# Altium footprint library lib_datalogger.PcbLib: 866 footprints (part 24 of 55)
Each footprint in its own frame and in the unit in brackets; x right, y up, seen from the top. Pads: shape width x height; smd on the part's side, far side on the other; paste and mask are expansions set on the pad; w line width, h text height; cw(c..) or ccw(c..) is an arc to the next point about the centre after c.
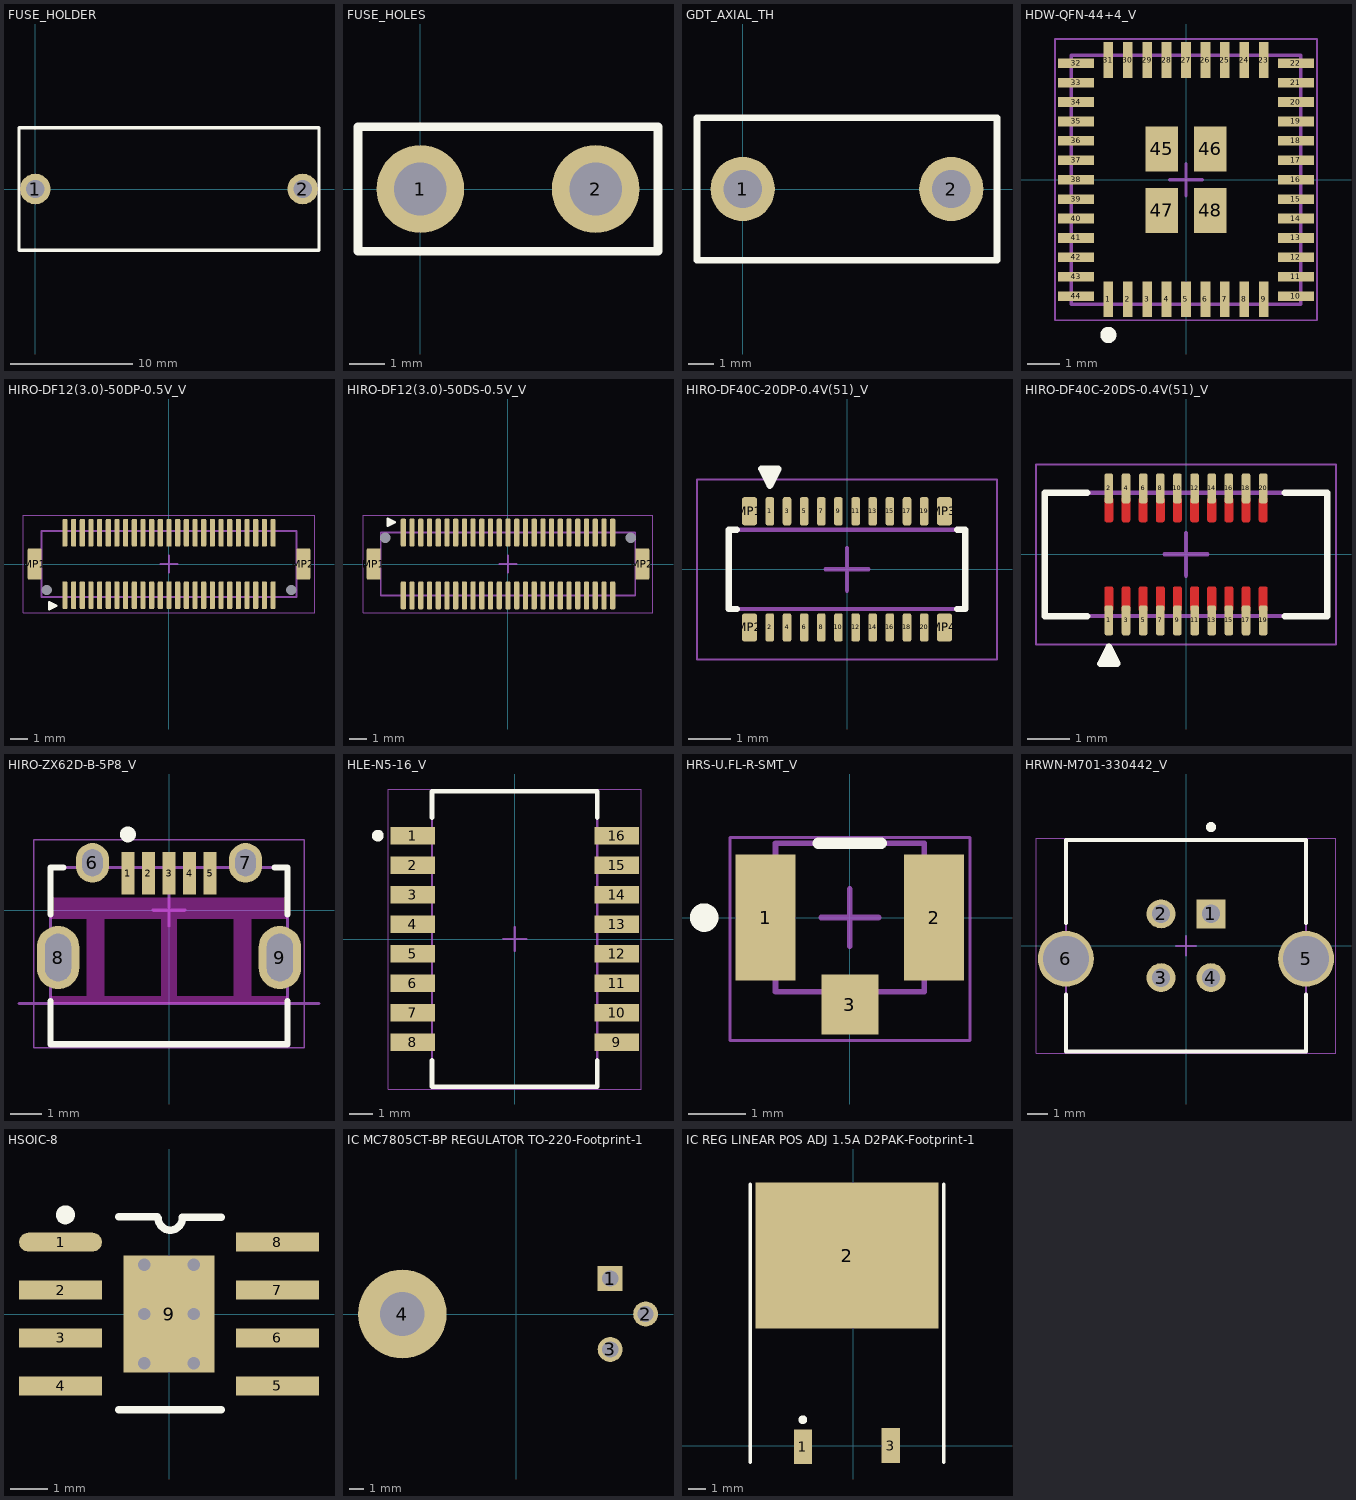
[diagram p23: the footprints below, top view; thin cyan lines are the x and y axes]

## FUSE_HOLDER [mm]
pads (2):
  round 2.5 hole 1.5: 1(0,0) 2(21.84,0)
Top Overlay:
  lines w0.254: -1.33,-5 -1.33,5 23.17,5 23.17,-5 -1.33,-5
3D body "fh2.step": height 10.8, standoff -3, extent -1.18,-4.9 23.02,4.9

## FUSE_HOLES [mm]
pads (2):
  round 2.5 hole 1.5: 1(0,0) 2(5,0)
Top Overlay:
  lines w0.254: -1.782,-1.778 6.782,-1.778 6.782,1.778 -1.782,1.778 -1.782,-1.778

## GDT_AXIAL_TH [mm]
pads (2):
  round 2.5 hole 1.5: 1(0,0) 2(8.128,0)
Top Overlay:
  lines w0.254: -1.782,-2.769 -1.782,2.769 9.91,2.769 9.91,-2.769 -1.782,-2.769
3D body "2037-09-B.step": height 10, standoff -3.7, extent -0.26,-2.489 8.54,2.511

## genericTLS [mm]
3D body "Placa_TLS_2.0.step": height -2.75, standoff -20.4, extent -32.4,-28.2 33.475,28.613

## HDW-QFN-44+4_V [mm] "QFN, 44-Leads, Body 7.7x7.1mm, Pitch 0.6mm"
height 1.4
pads (48):
  rect 0.3x1.1 smd: 1(-2.4,-3.7) 2(-1.8,-3.7) 3(-1.2,-3.7) 4(-0.6,-3.7) 5(0,-3.7) 6(0.6,-3.7) 7(1.2,-3.7) 8(1.8,-3.7) 9(2.4,-3.7) 23(2.4,3.7) 24(1.8,3.7) 25(1.2,3.7) 26(0.6,3.7) 27(0,3.7) 28(-0.6,3.7) 29(-1.2,3.7) 30(-1.8,3.7) 31(-2.4,3.7)
  rect 1.1x0.3 smd: 10(3.4,-3.6) 11(3.4,-3) 12(3.4,-2.4) 13(3.4,-1.8) 14(3.4,-1.2) 15(3.4,-0.6) 16(3.4,0) 17(3.4,0.6) 18(3.4,1.2) 19(3.4,1.8) 20(3.4,2.4) 21(3.4,3) 22(3.4,3.6) 32(-3.4,3.6) 33(-3.4,3) 34(-3.4,2.4) 35(-3.4,1.8) 36(-3.4,1.2) 37(-3.4,0.6) 38(-3.4,0) 39(-3.4,-0.6) 40(-3.4,-1.2) 41(-3.4,-1.8) 42(-3.4,-2.4) 43(-3.4,-3) 44(-3.4,-3.6)
  rect 1x1.4 smd: 45(-0.75,0.95) 46(0.75,0.95) 47(-0.75,-0.95) 48(0.75,-0.95)
Top Overlay:
  circle w0.25: c-2.4,-4.8 r0.125
Mechanical 13:
  lines w0.1: -3.55,-3.85 -3.55,3.85 3.55,3.85 3.55,-3.85 -3.55,-3.85
Mechanical 15:
  lines w0.05: -4.05,-4.35 -4.05,4.35 4.05,4.35 4.05,-4.35 -4.05,-4.35
  lines w0.1: -0.5,0 0.5,0 ; 0,-0.5 0,0.5
3D body: height 1.4, standoff 0, extent -3.55,-3.85 3.55,3.85

## HIRO-DF12(3.0)-50DP-0.5V_V [mm] "SMD, 50-Leads, Body 14.7x3.8mm, Pitch 0.5mm"
height 3.2
pads (54):
  rrect50% 0.3x1.6 smd paste-0.01: 1(-6,-1.8) 2(-6,1.8) 3(-5.5,-1.8) 4(-5.5,1.8) 5(-5,-1.8) 6(-5,1.8) 7(-4.5,-1.8) 8(-4.5,1.8) 9(-4,-1.8) 10(-4,1.8) 11(-3.5,-1.8) 12(-3.5,1.8) 13(-3,-1.8) 14(-3,1.8) 15(-2.5,-1.8) 16(-2.5,1.8) 17(-2,-1.8) 18(-2,1.8) 19(-1.5,-1.8) 20(-1.5,1.8) 21(-1,-1.8) 22(-1,1.8) 23(-0.5,-1.8) 24(-0.5,1.8) 25(0,-1.8) 26(0,1.8) 27(0.5,-1.8) 28(0.5,1.8) 29(1,-1.8) 30(1,1.8) 31(1.5,-1.8) 32(1.5,1.8) 33(2,-1.8) 34(2,1.8) 35(2.5,-1.8) 36(2.5,1.8) 37(3,-1.8) 38(3,1.8) 39(3.5,-1.8) 40(3.5,1.8) 41(4,-1.8) 42(4,1.8) 43(4.5,-1.8) 44(4.5,1.8) 45(5,-1.8) 46(5,1.8) 47(5.5,-1.8) 48(5.5,1.8) 49(6,-1.8) 50(6,1.8)
  round 0 hole 0.6 unplated: H1(7.05,-1.5) H2(-7.05,-1.5)
  rrect20% 0.8x1.8 smd: MP1(-7.75,0) MP2(7.75,0)
Top Overlay:
  region: -6.9,-2.6 -6.9,-2.2 -6.5,-2.4
  lines w0.15: -6.9,-2.6 -6.5,-2.4 -6.9,-2.2 -6.9,-2.6
Mechanical 13:
  lines w0.1: -7.35,-1.9 -7.35,1.9 7.35,1.9 7.35,-1.9 -7.35,-1.9
Mechanical 15:
  lines w0.05: -8.4,-2.8 8.4,-2.8 8.4,2.8 -8.4,2.8 -8.4,-2.8
  lines w0.1: -0.5,0 0.5,0 ; 0,-0.5 0,0.5
Top Designator:
  text ".Designator" at -1.27,-0.127 h0.6
3D body "DF12(3.0)-50DP-0.5V.stp": height 2.3, standoff -0.6, extent -7.8,-2.3 7.8,2.3

## HIRO-DF12(3.0)-50DS-0.5V_V [mm] "SMD, 50-Leads, Body 14.6x3.6mm, Pitch 0.5mm"
height 2.4
pads (54):
  rrect50% 0.3x1.6 smd paste-0.01: 1(-6,1.8) 2(-6,-1.8) 3(-5.5,1.8) 4(-5.5,-1.8) 5(-5,1.8) 6(-5,-1.8) 7(-4.5,1.8) 8(-4.5,-1.8) 9(-4,1.8) 10(-4,-1.8) 11(-3.5,1.8) 12(-3.5,-1.8) 13(-3,1.8) 14(-3,-1.8) 15(-2.5,1.8) 16(-2.5,-1.8) 17(-2,1.8) 18(-2,-1.8) 19(-1.5,1.8) 20(-1.5,-1.8) 21(-1,1.8) 22(-1,-1.8) 23(-0.5,1.8) 24(-0.5,-1.8) 25(0,1.8) 26(0,-1.8) 27(0.5,1.8) 28(0.5,-1.8) 29(1,1.8) 30(1,-1.8) 31(1.5,1.8) 32(1.5,-1.8) 33(2,1.8) 34(2,-1.8) 35(2.5,1.8) 36(2.5,-1.8) 37(3,1.8) 38(3,-1.8) 39(3.5,1.8) 40(3.5,-1.8) 41(4,1.8) 42(4,-1.8) 43(4.5,1.8) 44(4.5,-1.8) 45(5,1.8) 46(5,-1.8) 47(5.5,1.8) 48(5.5,-1.8) 49(6,1.8) 50(6,-1.8)
  round 0 hole 0.6 unplated: H1(-7.05,1.5) H2(7.05,1.5)
  rrect20% 0.8x1.8 smd: MP1(-7.7,0) MP2(7.7,0)
Top Overlay:
  region: -6.9,2.6 -6.9,2.2 -6.5,2.4
  lines w0.15: -6.9,2.2 -6.9,2.6 -6.5,2.4 -6.9,2.2
Mechanical 13:
  lines w0.1: -7.3,-1.8 -7.3,1.8 7.3,1.8 7.3,-1.8 -7.3,-1.8
Mechanical 15:
  lines w0.05: -8.3,-2.8 8.3,-2.8 8.3,2.8 -8.3,2.8 -8.3,-2.8
  lines w0.1: -0.5,0 0.5,0 ; 0,-0.5 0,0.5
Top Designator:
  text ".Designator" at -1.27,-0.127 h0.6
3D body "DF12(3.0)-50DS-0.5V.stp": height 2.2, standoff -0.6, extent -7.8,-2.3 7.8,2.3

## HIRO-DF40C-20DP-0.4V(51)_V [mm] "CONN, 20-Lead, Body 5.52x1.85mm, Pitch 0.4mm"
height 1.29
pads (24):
  rrect50% 0.2x0.66 smd: 1(-1.8,1.355) 2(-1.8,-1.355) 3(-1.4,1.355) 4(-1.4,-1.355) 5(-1,1.355) 6(-1,-1.355) 7(-0.6,1.355) 8(-0.6,-1.355) 9(-0.2,1.355) 10(-0.2,-1.355) 11(0.2,1.355) 12(0.2,-1.355) 13(0.6,1.355) 14(0.6,-1.355) 15(1,1.355) 16(1,-1.355) 17(1.4,1.355) 18(1.4,-1.355) 19(1.8,1.355) 20(1.8,-1.355)
  rrect35% 0.35x0.66 smd: MP1(-2.275,1.355) MP2(-2.275,-1.355) MP3(2.275,1.355) MP4(2.275,-1.355)
Top Overlay:
  region: -1.6,2.35 -2,2.35 -1.8,1.95
  lines w0.15: -2.575,-0.925 -2.76,-0.925 -2.76,0.925 -2.575,0.925 ; 2.575,-0.925 2.76,-0.925 2.76,0.925 2.575,0.925 ; -2,2.35 -1.8,1.95 -1.6,2.35 -2,2.35
Mechanical 13:
  lines w0.1: -2.76,-0.925 -2.76,0.925 2.76,0.925 2.76,-0.925 -2.76,-0.925
Mechanical 15:
  lines w0.05: -3.5,-2.1 3.5,-2.1 3.5,2.1 -3.5,2.1 -3.5,-2.1
  lines w0.1: -0.5,0 0.5,0 ; 0,-0.5 0,0.5
Top Designator:
  text ".Designator" at -1.27,-0.127 h0.6
3D body "DF40C-20DP.stp": height 1.14, standoff 0, extent -2.76,-1.485 2.76,1.485

## HIRO-DF40C-20DS-0.4V(51)_V [mm] "CONN, 20-Lead, Body 6.6x2.88mm, Pitch 0.4mm"
height 1.65
pads (20):
  rrect50% 0.2x0.7 smd: 1(-1.8,-1.54) 2(-1.8,1.54) 3(-1.4,-1.54) 4(-1.4,1.54) 5(-1,-1.54) 6(-1,1.54) 7(-0.6,-1.54) 8(-0.6,1.54) 9(-0.2,-1.54) 10(-0.2,1.54) 11(0.2,-1.54) 12(0.2,1.54) 13(0.6,-1.54) 14(0.6,1.54) 15(1,-1.54) 16(1,1.54) 17(1.4,-1.54) 18(1.4,1.54) 19(1.8,-1.54) 20(1.8,1.54)
Top Layer:
  region: -1.9,-1.3 -1.7,-1.3 -1.7,-0.8 -1.7,-0.79 -1.708,-0.772 -1.722,-0.758 -1.74,-0.75 -1.75,-0.75 -1.85,-0.75 -1.86,-0.75 -1.878,-0.758 -1.892,-0.772 -1.9,-0.79 -1.9,-0.8
  region: -1.5,-1.3 -1.3,-1.3 -1.3,-0.8 -1.3,-0.79 -1.308,-0.772 -1.322,-0.758 -1.34,-0.75 -1.35,-0.75 -1.45,-0.75 -1.46,-0.75 -1.478,-0.758 -1.492,-0.772 -1.5,-0.79 -1.5,-0.8
  region: -1.1,-1.3 -0.9,-1.3 -0.9,-0.8 -0.9,-0.79 -0.908,-0.772 -0.922,-0.758 -0.94,-0.75 -0.95,-0.75 -1.05,-0.75 -1.06,-0.75 -1.078,-0.758 -1.092,-0.772 -1.1,-0.79 -1.1,-0.8
  region: -0.7,-1.3 -0.5,-1.3 -0.5,-0.8 -0.5,-0.79 -0.508,-0.772 -0.522,-0.758 -0.54,-0.75 -0.55,-0.75 -0.65,-0.75 -0.66,-0.75 -0.678,-0.758 -0.692,-0.772 -0.7,-0.79 -0.7,-0.8
  region: -0.3,-1.3 -0.1,-1.3 -0.1,-0.8 -0.1,-0.79 -0.108,-0.772 -0.122,-0.758 -0.14,-0.75 -0.15,-0.75 -0.25,-0.75 -0.26,-0.75 -0.278,-0.758 -0.292,-0.772 -0.3,-0.79 -0.3,-0.8
  region: 0.1,-1.3 0.3,-1.3 0.3,-0.8 0.3,-0.79 0.292,-0.772 0.278,-0.758 0.26,-0.75 0.25,-0.75 0.15,-0.75 0.14,-0.75 0.122,-0.758 0.108,-0.772 0.1,-0.79 0.1,-0.8
  region: 0.5,-1.3 0.7,-1.3 0.7,-0.8 0.7,-0.79 0.692,-0.772 0.678,-0.758 0.66,-0.75 0.65,-0.75 0.55,-0.75 0.54,-0.75 0.522,-0.758 0.508,-0.772 0.5,-0.79 0.5,-0.8
  region: 0.9,-1.3 1.1,-1.3 1.1,-0.8 1.1,-0.79 1.092,-0.772 1.078,-0.758 1.06,-0.75 1.05,-0.75 0.95,-0.75 0.94,-0.75 0.922,-0.758 0.908,-0.772 0.9,-0.79 0.9,-0.8
  region: 1.3,-1.3 1.5,-1.3 1.5,-0.8 1.5,-0.79 1.492,-0.772 1.478,-0.758 1.46,-0.75 1.45,-0.75 1.35,-0.75 1.34,-0.75 1.322,-0.758 1.308,-0.772 1.3,-0.79 1.3,-0.8
  region: 1.7,-1.3 1.9,-1.3 1.9,-0.8 1.9,-0.79 1.892,-0.772 1.878,-0.758 1.86,-0.75 1.85,-0.75 1.75,-0.75 1.74,-0.75 1.722,-0.758 1.708,-0.772 1.7,-0.79 1.7,-0.8
  region: -1.7,1.3 -1.9,1.3 -1.9,0.8 -1.9,0.79 -1.892,0.772 -1.878,0.758 -1.86,0.75 -1.85,0.75 -1.75,0.75 -1.74,0.75 -1.722,0.758 -1.708,0.772 -1.7,0.79 -1.7,0.8
  region: -1.3,1.3 -1.5,1.3 -1.5,0.8 -1.5,0.79 -1.492,0.772 -1.478,0.758 -1.46,0.75 -1.45,0.75 -1.35,0.75 -1.34,0.75 -1.322,0.758 -1.308,0.772 -1.3,0.79 -1.3,0.8
  region: -0.9,1.3 -1.1,1.3 -1.1,0.8 -1.1,0.79 -1.092,0.772 -1.078,0.758 -1.06,0.75 -1.05,0.75 -0.95,0.75 -0.94,0.75 -0.922,0.758 -0.908,0.772 -0.9,0.79 -0.9,0.8
  region: -0.5,1.3 -0.7,1.3 -0.7,0.8 -0.7,0.79 -0.692,0.772 -0.678,0.758 -0.66,0.75 -0.65,0.75 -0.55,0.75 -0.54,0.75 -0.522,0.758 -0.508,0.772 -0.5,0.79 -0.5,0.8
  region: -0.1,1.3 -0.3,1.3 -0.3,0.8 -0.3,0.79 -0.292,0.772 -0.278,0.758 -0.26,0.75 -0.25,0.75 -0.15,0.75 -0.14,0.75 -0.122,0.758 -0.108,0.772 -0.1,0.79 -0.1,0.8
  region: 0.3,1.3 0.1,1.3 0.1,0.8 0.1,0.79 0.108,0.772 0.122,0.758 0.14,0.75 0.15,0.75 0.25,0.75 0.26,0.75 0.278,0.758 0.292,0.772 0.3,0.79 0.3,0.8
  region: 0.7,1.3 0.5,1.3 0.5,0.8 0.5,0.79 0.508,0.772 0.522,0.758 0.54,0.75 0.55,0.75 0.65,0.75 0.66,0.75 0.678,0.758 0.692,0.772 0.7,0.79 0.7,0.8
  region: 1.1,1.3 0.9,1.3 0.9,0.8 0.9,0.79 0.908,0.772 0.922,0.758 0.94,0.75 0.95,0.75 1.05,0.75 1.06,0.75 1.078,0.758 1.092,0.772 1.1,0.79 1.1,0.8
  region: 1.5,1.3 1.3,1.3 1.3,0.8 1.3,0.79 1.308,0.772 1.322,0.758 1.34,0.75 1.35,0.75 1.45,0.75 1.46,0.75 1.478,0.758 1.492,0.772 1.5,0.79 1.5,0.8
  region: 1.9,1.3 1.7,1.3 1.7,0.8 1.7,0.79 1.708,0.772 1.722,0.758 1.74,0.75 1.75,0.75 1.85,0.75 1.86,0.75 1.878,0.758 1.892,0.772 1.9,0.79 1.9,0.8
Top Overlay:
  region: -2,-2.55 -1.6,-2.55 -1.8,-2.15
  lines w0.15: -2.3,-1.44 -3.3,-1.44 -3.3,1.44 -2.3,1.44 ; 2.3,-1.44 3.3,-1.44 3.3,1.44 2.3,1.44 ; -2,-2.55 -1.8,-2.15 -1.6,-2.55 -2,-2.55
Mechanical 13:
  lines w0.1: -3.3,-1.44 3.3,-1.44 3.3,1.44 -3.3,1.44 -3.3,-1.44
Mechanical 15:
  lines w0.05: -3.5,-2.1 -3.5,2.1 3.5,2.1 3.5,-2.1 -3.5,-2.1
  lines w0.1: -0.5,0 0.5,0 ; 0,-0.5 0,0.5
Top Designator:
  text ".Designator" at -1.27,-0.127 h0.6
3D body "DF40C-20DS.stp": height 1.45, standoff 0, extent -3.3,-1.69 3.3,1.69

## HIRO-ZX62D-B-5P8_V [mm] "Micro-USB Connector, 9-Leads, Body 7.5x5.6mm, Pitch 0.65mm"
height 2.65
pads (9):
  rect 0.4x1.35 smd: 1(-1.3,1.175) 2(-0.65,1.175) 3(0,1.175) 4(0.65,1.175) 5(1.3,1.175)
  oval 1.05x1.25 hole 0.65 slot 0.85 at 90 deg: 6(-2.425,1.5) 7(2.425,1.5)
  oval 1.35x2 hole 0.825 slot 1.5 at 90 deg: 8(-3.512,-1.5) 9(3.512,-1.5)
Top Layer keep-out:
  region: 2.55,-2 2.1,-2 2.1,-1 2.55,-1
  region: -2.55,-2 -2.1,-2 -2.1,-1 -2.55,-1
  region: -0.18,-1.8 -0.18,-1 0.18,-1 0.18,-1.8
  region: -3.75,-2.725 -2.6,-2.725 -2.6,-1.5 -2.05,-1.5 -2.05,-2.725 -0.25,-2.725 -0.25,-1.5 0.25,-1.5 0.25,-2.725 2.05,-2.725 2.05,-1.5 2.6,-1.5 2.6,-2.725 3.75,-2.725 3.75,-2.95 -3.75,-2.95
  region: -2.6,-1.5 -2.05,-1.5 -2.05,-0.275 -0.25,-0.275 -0.25,-1.5 0.25,-1.5 0.25,-0.275 2.05,-0.275 2.05,-1.5 2.6,-1.5 2.6,-0.275 3.75,-0.275 3.75,0.395 -3.75,0.395 -3.75,-0.275 -2.6,-0.275
Top Overlay:
  circle w0.25: c-1.3,2.4 r0.125
  lines w0.2: -3.75,-2.873 -3.75,-4.25 3.75,-4.25 3.75,-2.873 ; -3.75,-0.127 -3.75,1.35 -3.349,1.35 ; 3.349,1.35 3.75,1.35 3.75,-0.127
Mechanical 1:
  lines w0.1: -4.75,-2.95 4.75,-2.95
  text "Board Edge" at -1.568,-3.405 h0.3
Mechanical 13:
  lines w0.1: -3.75,-4.25 3.75,-4.25 3.75,-2.95 3.75,1.35 -3.75,1.35 -3.75,-2.95 -3.75,-4.25
Mechanical 15:
  lines w0.05: -4.287,-4.35 4.287,-4.35 4.287,2.225 -4.287,2.225 -4.287,-4.35
  lines w0.1: -0.5,0 0.5,0 ; 0,-0.5 0,0.5
3D body "ZX62D-B-5P8.stp": height 2.75, standoff -0.75, extent -4.047,-4.149 4.047,1.651

## HLE-N5-16_V [mm] "SMD, 16-Leads, Body 12.7x7.11mm, Pitch 1.27mm"
height 6.35
pads (16):
  rect 1.91x0.76 smd paste+0: 1(-4.38,4.445) 2(-4.38,3.175) 3(-4.38,1.905) 4(-4.38,0.635) 5(-4.38,-0.635) 6(-4.38,-1.905) 7(-4.38,-3.175) 8(-4.38,-4.445) 9(4.38,-4.445) 10(4.38,-3.175) 11(4.38,-1.905) 12(4.38,-0.635) 13(4.38,0.635) 14(4.38,1.905) 15(4.38,3.175) 16(4.38,4.445)
Top Overlay:
  circle w0.25: c-5.887,4.445 r0.127
  lines w0.2: -3.555,-5.225 -3.555,-6.35 3.555,-6.35 3.555,-5.225 ; -3.555,5.225 -3.555,6.35 3.555,6.35 3.555,5.225
Mechanical 13:
  lines w0.1: -3.555,-6.35 3.555,-6.35 3.555,6.35 -3.555,6.35 -3.555,-6.35
Mechanical 15:
  lines w0.05: -5.435,-6.45 5.435,-6.45 5.435,6.45 -5.435,6.45 -5.435,-6.45
  lines w0.1: -0.5,0 0.5,0 ; 0,-0.5 0,0.5
3D body: height 6.35, standoff 0.25, extent -3.555,-6.35 3.555,6.35

## HRS-U.FL-R-SMT_V [mm] "SMD, 3-Leads, Body 2.6x2.6mm"
height 1.25
pads (3):
  rect 1.05x2.2 smd: 1(-1.475,0) 2(1.475,0)
  rect 1x1.05 smd: 3(0,-1.525)
Top Overlay:
  circle w0.25: c-2.55,0 r0.125
  lines w0.2: -0.55,1.3 0.55,1.3
Mechanical 13:
  lines w0.1: -1.3,-1.3 1.3,-1.3 1.3,1.3 -1.3,1.3 -1.3,-1.3
Mechanical 15:
  lines w0.05: -2.1,-2.15 2.1,-2.15 2.1,1.4 -2.1,1.4 -2.1,-2.15
  lines w0.1: -0.5,0 0.5,0 ; 0,-0.5 0,0.5
3D body: height 0.35, standoff 0, extent -1.3,-1.3 1.3,1.3
3D body: height 1.25, standoff 0, extent -1,-1 1,1

## HRWN-M701-330442_V [mm] "USB, 4-Leads, Body 12.04x10.6mm, Pitch 2.5mm"
height 16.25
pads (6):
  rect 1.45x1.45 hole 0.92: 1(1.25,1.6)
  round 1.45 hole 0.92: 2(-1.25,1.6) 3(-1.25,-1.6) 4(1.25,-1.6)
  round 2.8 hole 2.3: 5(6.02,-0.65) 6(-6.02,-0.65)
Top Overlay:
  circle w0.25: c1.25,5.952 r0.127
  lines w0.2: -6.02,-2.45 -6.02,-5.3 6.02,-5.3 6.02,-2.45 ; -6.02,1.15 -6.02,5.3 6.02,5.3 6.02,1.15
Mechanical 13:
  lines w0.1: -6.02,-5.3 -6.02,5.3 6.02,5.3 6.02,-5.3 -6.02,-5.3
Mechanical 15:
  lines w0.05: -7.52,-5.4 -7.52,5.4 7.52,5.4 7.52,-5.4 -7.52,-5.4
  lines w0.1: -0.5,0 0.5,0 ; 0,-0.5 0,0.5
3D body "m701-330442_asm.stp": height 16.5, standoff -5.1, extent -7.33,-5.715 7.33,4.985

## HSOIC-8 [mm]
pads (9):
  oval 2.2x0.5 smd mask+0.07: 1(-2.875,1.905)
  rect 2.2x0.5 smd mask+0.07: 2(-2.875,0.635) 3(-2.875,-0.635) 4(-2.875,-1.905) 5(2.875,-1.905) 6(2.875,-0.635) 7(2.875,0.635) 8(2.875,1.905)
  rect 2.4x3.1 smd mask+0.25: 9(0,0)
via -0.65,-1.3 diameter 0.33 hole 0.33
via 0.65,-1.3 diameter 0.33 hole 0.33
via 0.65,0 diameter 0.33 hole 0.33
via -0.65,0 diameter 0.33 hole 0.33
via -0.65,1.3 diameter 0.33 hole 0.33
via 0.65,1.3 diameter 0.33 hole 0.33
Top Overlay:
  circle w0.254: c-2.745,2.629 r0.125
  lines w0.2: -1.325,-2.54 1.38,-2.54 ; -1.325,2.578 -0.309,2.578 ; -0.284,2.54 ccw(c0.034,2.54) 0.352,2.54 ; 0.352,2.565 1.38,2.565
3D body "User Library-SOIC-8.STEP": height 1.75, standoff 0, extent -2.978,-2.5 3.033,2.5

## IC MC7805CT-BP REGULATOR TO-220-Footprint-1 [mil]
pads (4):
  rect 70x70 hole 46: 1(265,100)
  round 70 hole 46: 2(365,0) 3(265,-100)
  round 250 hole 125: 4(-321,0)
Bottom Overlay:
  lines w10: -76,-202 -76,202 ; -26,-202 -26,202 ; -441,-202 -441,202 179,202 179,-202 -441,-202
3D body: height 100, standoff -50, extent 245,80 285,120
3D body: height 100, standoff -50, extent 345,-20 385,20
3D body: height 100, standoff -50, extent 245,-120 285,-80
3D body: height 120, standoff 80, extent 245,-120 285,-80
3D body: height 120, standoff 80, extent 115,-120 265,-80
3D body: height 120, standoff 80, extent 115,80 265,120
3D body: height 120, standoff 80, extent 115,-20 365,20
3D body: height 120, standoff 80, extent 345,-20 385,20
3D body: height 120, standoff 80, extent 245,80 285,120
3D body: height 150, standoff 5, extent -80,-200 175,195
3D body: height 20, standoff 5, extent -445,-200 -75,200

## IC REG LINEAR POS ADJ 1.5A D2PAK-Footprint-1 [mm]
pads (3):
  rect 1.05x2 smd: 1(-2.896,-0.064) 3(2.159,0)
  rect 10.55x8.4 smd: 2(-0.356,10.936)
Top Overlay:
  circle w0.25: c-2.896,1.486 r0.125
  lines w0.2: -5.931,-0.964 -5.931,15.036 ; 5.219,-0.964 5.219,15.036
3D body "User Library-d2pak_a.step": height 4.5, standoff -0.03, extent -5.501,-0.889 4.699,14.118